# Altium footprint library CONN_HDR_MINI_ST_SMD.PcbLib: 102 footprints (part 4 of 7) (continued)
## HDRMINIS_M_1X19 [mm] "mini header (50mil pitch)" (continued)
3D body "BD021-03A-A1-0350-0200-0550-LB.stp": height 5.5, standoff 0, extent -12.07,-2.75 -8.26,2.75

## HDRMINIS_M_1X20 [mm] "mini header (50mil pitch)"
pads (20):
  oval 0.8x3.2 smd mask+0.1: 1(-12.065,-1.4) 2(-10.795,1.4) 3(-9.525,-1.4) 4(-8.255,1.4) 5(-6.985,-1.4) 6(-5.715,1.4) 7(-4.445,-1.4) 8(-3.175,1.4) 9(-1.905,-1.4) 10(-0.635,1.4) 11(0.635,-1.4) 12(1.905,1.4) 13(3.175,-1.4) 14(4.445,1.4) 15(5.715,-1.4) 16(6.985,1.4) 17(8.255,-1.4) 18(9.525,1.4) 19(10.795,-1.4) 20(12.065,1.4)
Top Overlay:
  circle w0.2: c-13.208,0 r0.2
  lines w0.2: -12.601,-0.8 -12.7,-0.635 -12.7,0.635 -12.601,0.8 -11.529,0.8 -11.43,0.635 -11.331,0.8 ; -11.529,-0.8 -11.43,-0.635 -11.331,-0.8 -10.259,-0.8 -10.16,-0.635 -10.061,-0.8 ; -10.259,0.8 -10.16,0.635 -10.061,0.8 -8.989,0.8 -8.89,0.635 -8.791,0.8 ; -8.989,-0.8 -8.89,-0.635 -8.791,-0.8 -7.719,-0.8 -7.62,-0.635 -7.521,-0.8 ; -7.719,0.8 -7.62,0.635 -7.521,0.8 -6.449,0.8 -6.35,0.635 -6.251,0.8 ; -6.449,-0.8 -6.35,-0.635 -6.251,-0.8 -5.179,-0.8 -5.08,-0.635 -4.981,-0.8 ; -5.179,0.8 -5.08,0.635 -4.981,0.8 -3.909,0.8 -3.81,0.635 -3.711,0.8 ; -3.909,-0.8 -3.81,-0.635 -3.711,-0.8 -2.639,-0.8 -2.54,-0.635 -2.441,-0.8 ; -2.639,0.8 -2.54,0.635 -2.441,0.8 -1.369,0.8 -1.27,0.635 -1.171,0.8 ; -1.369,-0.8 -1.27,-0.635 -1.171,-0.8 -0.099,-0.8 0,-0.635 0.099,-0.8 ; -0.099,0.8 0,0.635 0.099,0.8 1.171,0.8 1.27,0.635 1.369,0.8 ; 1.171,-0.8 1.27,-0.635 1.369,-0.8 2.441,-0.8 2.54,-0.635 2.639,-0.8 ; 2.441,0.8 2.54,0.635 2.639,0.8 3.711,0.8 3.81,0.635 3.909,0.8 ; 3.711,-0.8 3.81,-0.635 3.909,-0.8 4.981,-0.8 5.08,-0.635 5.179,-0.8 ; 4.981,0.8 5.08,0.635 5.179,0.8 6.251,0.8 6.35,0.635 6.449,0.8 ; 6.251,-0.8 6.35,-0.635 6.449,-0.8 7.521,-0.8 7.62,-0.635 7.719,-0.8 ; 7.521,0.8 7.62,0.635 7.719,0.8 8.791,0.8 8.89,0.635 8.989,0.8 ; 8.791,-0.8 8.89,-0.635 8.989,-0.8 10.061,-0.8 10.16,-0.635 10.259,-0.8 ; 10.061,0.8 10.16,0.635 10.259,0.8 11.331,0.8 11.43,0.635 11.529,0.8 ; 11.331,-0.8 11.43,-0.635 11.529,-0.8 12.601,-0.8 12.7,-0.635 12.7,0.635 12.601,0.8
3D body "BD021-02A-A1-0350-0200-0550-LB.stp": height 5.5, standoff 0, extent -12.7,-2.75 -10.16,2.75
3D body "BD021-02A-A1-0350-0200-0550-LB.stp": height 5.5, standoff 0, extent -10.16,-2.75 -7.62,2.75
3D body "BD021-02A-A1-0350-0200-0550-LB.stp": height 5.5, standoff 0, extent -7.62,-2.75 -5.08,2.75
3D body "BD021-02A-A1-0350-0200-0550-LB.stp": height 5.5, standoff 0, extent -5.08,-2.75 -2.54,2.75
3D body "BD021-02A-A1-0350-0200-0550-LB.stp": height 5.5, standoff 0, extent -2.54,-2.75 0,2.75
3D body "BD021-02A-A1-0350-0200-0550-LB.stp": height 5.5, standoff 0, extent 0,-2.75 2.54,2.75
3D body "BD021-02A-A1-0350-0200-0550-LB.stp": height 5.5, standoff 0, extent 2.54,-2.75 5.08,2.75
3D body "BD021-02A-A1-0350-0200-0550-LB.stp": height 5.5, standoff 0, extent 5.08,-2.75 7.62,2.75
3D body "BD021-02A-A1-0350-0200-0550-LB.stp": height 5.5, standoff 0, extent 7.62,-2.75 10.16,2.75
3D body "BD021-02A-A1-0350-0200-0550-LB.stp": height 5.5, standoff 0, extent 10.16,-2.75 12.7,2.75

## HDRMINIS_M_1X21 [mm] "mini header (50mil pitch)"
pads (21):
  oval 0.8x3.2 smd mask+0.1: 1(-12.7,1.4) 2(-11.43,-1.4) 3(-10.16,1.4) 4(-8.89,-1.4) 5(-7.62,1.4) 6(-6.35,-1.4) 7(-5.08,1.4) 8(-3.81,-1.4) 9(-2.54,1.4) 10(-1.27,-1.4) 11(0,1.4) 12(1.27,-1.4) 13(2.54,1.4) 14(3.81,-1.4) 15(5.08,1.4) 16(6.35,-1.4) 17(7.62,1.4) 18(8.89,-1.4) 19(10.16,1.4) 20(11.43,-1.4) 21(12.7,1.4)
Top Overlay:
  circle w0.2: c-13.843,0 r0.2
  lines w0.2: -13.236,0.8 -13.335,0.635 -13.335,-0.635 -13.236,-0.8 -12.164,-0.8 -12.065,-0.635 -11.966,-0.8 ; -12.164,0.8 -12.065,0.635 -11.966,0.8 -10.894,0.8 -10.795,0.635 -10.696,0.8 ; -10.894,-0.8 -10.795,-0.635 -10.696,-0.8 -9.624,-0.8 -9.525,-0.635 -9.426,-0.8 ; -9.624,0.8 -9.525,0.635 -9.426,0.8 -8.354,0.8 -8.255,0.635 -8.156,0.8 ; -8.354,-0.8 -8.255,-0.635 -8.156,-0.8 -7.084,-0.8 -6.985,-0.635 -6.886,-0.8 ; -7.084,0.8 -6.985,0.635 -6.886,0.8 -5.814,0.8 -5.715,0.635 -5.616,0.8 ; -5.814,-0.8 -5.715,-0.635 -5.616,-0.8 -4.544,-0.8 -4.445,-0.635 -4.346,-0.8 ; -4.544,0.8 -4.445,0.635 -4.346,0.8 -3.274,0.8 -3.175,0.635 -3.076,0.8 ; -3.274,-0.8 -3.175,-0.635 -3.076,-0.8 -2.004,-0.8 -1.905,-0.635 -1.806,-0.8 ; -2.004,0.8 -1.905,0.635 -1.806,0.8 -0.734,0.8 -0.635,0.635 -0.536,0.8 ; -0.734,-0.8 -0.635,-0.635 -0.536,-0.8 0.536,-0.8 0.635,-0.635 0.734,-0.8 ; 0.536,0.8 0.635,0.635 0.734,0.8 1.806,0.8 1.905,0.635 2.004,0.8 ; 1.806,-0.8 1.905,-0.635 2.004,-0.8 3.076,-0.8 3.175,-0.635 3.274,-0.8 ; 3.076,0.8 3.175,0.635 3.274,0.8 4.346,0.8 4.445,0.635 4.544,0.8 ; 4.346,-0.8 4.445,-0.635 4.544,-0.8 5.616,-0.8 5.715,-0.635 5.814,-0.8 ; 5.616,0.8 5.715,0.635 5.814,0.8 6.886,0.8 6.985,0.635 7.084,0.8 ; 6.886,-0.8 6.985,-0.635 7.084,-0.8 8.156,-0.8 8.255,-0.635 8.354,-0.8 ; 8.156,0.8 8.255,0.635 8.354,0.8 9.426,0.8 9.525,0.635 9.624,0.8 ; 9.426,-0.8 9.525,-0.635 9.624,-0.8 10.696,-0.8 10.795,-0.635 10.894,-0.8 ; 10.696,0.8 10.795,0.635 10.894,0.8 11.966,0.8 12.065,0.635 12.164,0.8 ; 11.966,-0.8 12.065,-0.635 12.164,-0.8 13.236,-0.8 13.335,-0.635 13.335,0.635 13.236,0.8
3D body "BD021-03A-A1-0350-0200-0550-LB.stp": height 5.5, standoff 0, extent -13.34,-2.75 -9.53,2.75
3D body "BD021-02A-A1-0350-0200-0550-LB.stp": height 5.5, standoff 0, extent -9.525,-2.75 -6.985,2.75
3D body "BD021-02A-A1-0350-0200-0550-LB.stp": height 5.5, standoff 0, extent -6.985,-2.75 -4.445,2.75
3D body "BD021-02A-A1-0350-0200-0550-LB.stp": height 5.5, standoff 0, extent -4.445,-2.75 -1.905,2.75
3D body "BD021-02A-A1-0350-0200-0550-LB.stp": height 5.5, standoff 0, extent -1.905,-2.75 0.635,2.75
3D body "BD021-02A-A1-0350-0200-0550-LB.stp": height 5.5, standoff 0, extent 0.635,-2.75 3.175,2.75
3D body "BD021-02A-A1-0350-0200-0550-LB.stp": height 5.5, standoff 0, extent 3.175,-2.75 5.715,2.75
3D body "BD021-02A-A1-0350-0200-0550-LB.stp": height 5.5, standoff 0, extent 5.715,-2.75 8.255,2.75
3D body "BD021-02A-A1-0350-0200-0550-LB.stp": height 5.5, standoff 0, extent 8.255,-2.75 10.795,2.75
3D body "BD021-02A-A1-0350-0200-0550-LB.stp": height 5.5, standoff 0, extent 10.795,-2.75 13.335,2.75

## HDRMINIS_M_1X22 [mm] "mini header (50mil pitch)"
pads (22):
  oval 0.8x3.2 smd mask+0.1: 1(-13.335,-1.4) 2(-12.065,1.4) 3(-10.795,-1.4) 4(-9.525,1.4) 5(-8.255,-1.4) 6(-6.985,1.4) 7(-5.715,-1.4) 8(-4.445,1.4) 9(-3.175,-1.4) 10(-1.905,1.4) 11(-0.635,-1.4) 12(0.635,1.4) 13(1.905,-1.4) 14(3.175,1.4) 15(4.445,-1.4) 16(5.715,1.4) 17(6.985,-1.4) 18(8.255,1.4) 19(9.525,-1.4) 20(10.795,1.4) 21(12.065,-1.4) 22(13.335,1.4)
Top Overlay:
  circle w0.2: c-14.478,0 r0.2
  lines w0.2: -13.871,-0.8 -13.97,-0.635 -13.97,0.635 -13.871,0.8 -12.799,0.8 -12.7,0.635 -12.601,0.8 ; -12.799,-0.8 -12.7,-0.635 -12.601,-0.8 -11.529,-0.8 -11.43,-0.635 -11.331,-0.8 ; -11.529,0.8 -11.43,0.635 -11.331,0.8 -10.259,0.8 -10.16,0.635 -10.061,0.8 ; -10.259,-0.8 -10.16,-0.635 -10.061,-0.8 -8.989,-0.8 -8.89,-0.635 -8.791,-0.8 ; -8.989,0.8 -8.89,0.635 -8.791,0.8 -7.719,0.8 -7.62,0.635 -7.521,0.8 ; -7.719,-0.8 -7.62,-0.635 -7.521,-0.8 -6.449,-0.8 -6.35,-0.635 -6.251,-0.8 ; -6.449,0.8 -6.35,0.635 -6.251,0.8 -5.179,0.8 -5.08,0.635 -4.981,0.8 ; -5.179,-0.8 -5.08,-0.635 -4.981,-0.8 -3.909,-0.8 -3.81,-0.635 -3.711,-0.8 ; -3.909,0.8 -3.81,0.635 -3.711,0.8 -2.639,0.8 -2.54,0.635 -2.441,0.8 ; -2.639,-0.8 -2.54,-0.635 -2.441,-0.8 -1.369,-0.8 -1.27,-0.635 -1.171,-0.8 ; -1.369,0.8 -1.27,0.635 -1.171,0.8 -0.099,0.8 0,0.635 0.099,0.8 ; -0.099,-0.8 0,-0.635 0.099,-0.8 1.171,-0.8 1.27,-0.635 1.369,-0.8 ; 1.171,0.8 1.27,0.635 1.369,0.8 2.441,0.8 2.54,0.635 2.639,0.8 ; 2.441,-0.8 2.54,-0.635 2.639,-0.8 3.711,-0.8 3.81,-0.635 3.909,-0.8 ; 3.711,0.8 3.81,0.635 3.909,0.8 4.981,0.8 5.08,0.635 5.179,0.8 ; 4.981,-0.8 5.08,-0.635 5.179,-0.8 6.251,-0.8 6.35,-0.635 6.449,-0.8 ; 6.251,0.8 6.35,0.635 6.449,0.8 7.521,0.8 7.62,0.635 7.719,0.8 ; 7.521,-0.8 7.62,-0.635 7.719,-0.8 8.791,-0.8 8.89,-0.635 8.989,-0.8 ; 8.791,0.8 8.89,0.635 8.989,0.8 10.061,0.8 10.16,0.635 10.259,0.8 ; 10.061,-0.8 10.16,-0.635 10.259,-0.8 11.331,-0.8 11.43,-0.635 11.529,-0.8 ; 11.331,0.8 11.43,0.635 11.529,0.8 12.601,0.8 12.7,0.635 12.799,0.8 ; 12.601,-0.8 12.7,-0.635 12.799,-0.8 13.871,-0.8 13.97,-0.635 13.97,0.635 13.871,0.8
3D body "BD021-02A-A1-0350-0200-0550-LB.stp": height 5.5, standoff 0, extent -13.97,-2.75 -11.43,2.75
3D body "BD021-02A-A1-0350-0200-0550-LB.stp": height 5.5, standoff 0, extent -11.43,-2.75 -8.89,2.75
3D body "BD021-02A-A1-0350-0200-0550-LB.stp": height 5.5, standoff 0, extent -8.89,-2.75 -6.35,2.75
3D body "BD021-02A-A1-0350-0200-0550-LB.stp": height 5.5, standoff 0, extent -6.35,-2.75 -3.81,2.75
3D body "BD021-02A-A1-0350-0200-0550-LB.stp": height 5.5, standoff 0, extent -3.81,-2.75 -1.27,2.75
3D body "BD021-02A-A1-0350-0200-0550-LB.stp": height 5.5, standoff 0, extent -1.27,-2.75 1.27,2.75
3D body "BD021-02A-A1-0350-0200-0550-LB.stp": height 5.5, standoff 0, extent 1.27,-2.75 3.81,2.75
3D body "BD021-02A-A1-0350-0200-0550-LB.stp": height 5.5, standoff 0, extent 3.81,-2.75 6.35,2.75
3D body "BD021-02A-A1-0350-0200-0550-LB.stp": height 5.5, standoff 0, extent 6.35,-2.75 8.89,2.75
3D body "BD021-02A-A1-0350-0200-0550-LB.stp": height 5.5, standoff 0, extent 8.89,-2.75 11.43,2.75
3D body "BD021-02A-A1-0350-0200-0550-LB.stp": height 5.5, standoff 0, extent 11.43,-2.75 13.97,2.75

## HDRMINIS_M_1X23 [mm] "mini header (50mil pitch)"
pads (23):
  oval 0.8x3.2 smd mask+0.1: 1(-13.97,1.4) 2(-12.7,-1.4) 3(-11.43,1.4) 4(-10.16,-1.4) 5(-8.89,1.4) 6(-7.62,-1.4) 7(-6.35,1.4) 8(-5.08,-1.4) 9(-3.81,1.4) 10(-2.54,-1.4) 11(-1.27,1.4) 12(0,-1.4) 13(1.27,1.4) 14(2.54,-1.4) 15(3.81,1.4) 16(5.08,-1.4) 17(6.35,1.4) 18(7.62,-1.4) 19(8.89,1.4) 20(10.16,-1.4) 21(11.43,1.4) 22(12.7,-1.4) 23(13.97,1.4)
Top Overlay:
  circle w0.2: c-15.113,0 r0.2
  lines w0.2: -14.506,0.8 -14.605,0.635 -14.605,-0.635 -14.506,-0.8 -13.434,-0.8 -13.335,-0.635 -13.236,-0.8 ; -13.335,0.635 -13.236,0.8 -12.164,0.8 -12.065,0.635 -11.966,0.8 ; -12.164,-0.8 -12.065,-0.635 -11.966,-0.8 -10.894,-0.8 -10.795,-0.635 -10.696,-0.8 ; -10.894,0.8 -10.795,0.635 -10.696,0.8 -9.624,0.8 -9.525,0.635 -9.426,0.8 ; -9.624,-0.8 -9.525,-0.635 -9.426,-0.8 -8.354,-0.8 -8.255,-0.635 -8.156,-0.8 ; -8.354,0.8 -8.255,0.635 -8.156,0.8 -7.084,0.8 -6.985,0.635 -6.886,0.8 ; -7.084,-0.8 -6.985,-0.635 -6.886,-0.8 -5.814,-0.8 -5.715,-0.635 -5.616,-0.8 ; -5.814,0.8 -5.715,0.635 -5.616,0.8 -4.544,0.8 -4.445,0.635 -4.346,0.8 ; -4.544,-0.8 -4.445,-0.635 -4.346,-0.8 -3.274,-0.8 -3.175,-0.635 -3.076,-0.8 ; -3.274,0.8 -3.175,0.635 -3.076,0.8 -2.004,0.8 -1.905,0.635 -1.806,0.8 ; -2.004,-0.8 -1.905,-0.635 -1.806,-0.8 -0.734,-0.8 -0.635,-0.635 -0.536,-0.8 ; -0.734,0.8 -0.635,0.635 -0.536,0.8 0.536,0.8 0.635,0.635 0.734,0.8 ; 0.536,-0.8 0.635,-0.635 0.734,-0.8 1.806,-0.8 1.905,-0.635 2.004,-0.8 ; 1.806,0.8 1.905,0.635 2.004,0.8 3.076,0.8 3.175,0.635 3.274,0.8 ; 3.076,-0.8 3.175,-0.635 3.274,-0.8 4.346,-0.8 4.445,-0.635 4.544,-0.8 ; 4.346,0.8 4.445,0.635 4.544,0.8 5.616,0.8 5.715,0.635 5.814,0.8 ; 5.616,-0.8 5.715,-0.635 5.814,-0.8 6.886,-0.8 6.985,-0.635 7.084,-0.8 ; 6.886,0.8 6.985,0.635 7.084,0.8 8.156,0.8 8.255,0.635 8.354,0.8 ; 8.156,-0.8 8.255,-0.635 8.354,-0.8 9.426,-0.8 9.525,-0.635 9.624,-0.8 ; 9.426,0.8 9.525,0.635 9.624,0.8 10.696,0.8 10.795,0.635 10.894,0.8 ; 10.696,-0.8 10.795,-0.635 10.894,-0.8 11.966,-0.8 12.065,-0.635 12.164,-0.8 ; 11.966,0.8 12.065,0.635 12.164,0.8 13.236,0.8 13.335,0.635 13.434,0.8 ; 13.236,-0.8 13.335,-0.635 13.434,-0.8 14.506,-0.8 14.605,-0.635 14.605,0.635 14.506,0.8
3D body "BD021-02A-A1-0350-0200-0550-LB.stp": height 5.5, standoff 0, extent 12.065,-2.75 14.605,2.75
3D body "BD021-02A-A1-0350-0200-0550-LB.stp": height 5.5, standoff 0, extent 9.525,-2.75 12.065,2.75
3D body "BD021-02A-A1-0350-0200-0550-LB.stp": height 5.5, standoff 0, extent 6.985,-2.75 9.525,2.75
3D body "BD021-02A-A1-0350-0200-0550-LB.stp": height 5.5, standoff 0, extent 4.445,-2.75 6.985,2.75
3D body "BD021-02A-A1-0350-0200-0550-LB.stp": height 5.5, standoff 0, extent 1.905,-2.75 4.445,2.75
3D body "BD021-02A-A1-0350-0200-0550-LB.stp": height 5.5, standoff 0, extent -0.635,-2.75 1.905,2.75
3D body "BD021-02A-A1-0350-0200-0550-LB.stp": height 5.5, standoff 0, extent -3.175,-2.75 -0.635,2.75
3D body "BD021-02A-A1-0350-0200-0550-LB.stp": height 5.5, standoff 0, extent -5.715,-2.75 -3.175,2.75
3D body "BD021-02A-A1-0350-0200-0550-LB.stp": height 5.5, standoff 0, extent -8.255,-2.75 -5.715,2.75
3D body "BD021-02A-A1-0350-0200-0550-LB.stp": height 5.5, standoff 0, extent -10.795,-2.75 -8.255,2.75
3D body "BD021-03A-A1-0350-0200-0550-LB.stp": height 5.5, standoff 0, extent -14.61,-2.75 -10.8,2.75

## HDRMINIS_M_1X24 [mm] "mini header (50mil pitch)"
pads (24):
  oval 0.8x3.2 smd mask+0.1: 1(-14.605,-1.4) 2(-13.335,1.4) 3(-12.065,-1.4) 4(-10.795,1.4) 5(-9.525,-1.4) 6(-8.255,1.4) 7(-6.985,-1.4) 8(-5.715,1.4) 9(-4.445,-1.4) 10(-3.175,1.4) 11(-1.905,-1.4) 12(-0.635,1.4) 13(0.635,-1.4) 14(1.905,1.4) 15(3.175,-1.4) 16(4.445,1.4) 17(5.715,-1.4) 18(6.985,1.4) 19(8.255,-1.4) 20(9.525,1.4) 21(10.795,-1.4) 22(12.065,1.4) 23(13.335,-1.4) 24(14.605,1.4)
Top Overlay:
  circle w0.2: c-15.748,0 r0.2
  lines w0.2: -15.141,-0.8 -15.24,-0.635 -15.24,0.635 -15.141,0.8 -14.069,0.8 -13.97,0.635 -13.871,0.8 ; -14.069,-0.8 -13.97,-0.635 -13.871,-0.8 -12.799,-0.8 -12.7,-0.635 -12.601,-0.8 ; -12.799,0.8 -12.7,0.635 -12.601,0.8 -11.529,0.8 -11.43,0.635 -11.331,0.8 ; -11.529,-0.8 -11.43,-0.635 -11.331,-0.8 -10.259,-0.8 -10.16,-0.635 -10.061,-0.8 ; -10.259,0.8 -10.16,0.635 -10.061,0.8 -8.989,0.8 -8.89,0.635 -8.791,0.8 ; -8.989,-0.8 -8.89,-0.635 -8.791,-0.8 -7.719,-0.8 -7.62,-0.635 -7.521,-0.8 ; -7.719,0.8 -7.62,0.635 -7.521,0.8 -6.449,0.8 -6.35,0.635 -6.251,0.8 ; -6.449,-0.8 -6.35,-0.635 -6.251,-0.8 -5.179,-0.8 -5.08,-0.635 -4.981,-0.8 ; -5.179,0.8 -5.08,0.635 -4.981,0.8 -3.909,0.8 -3.81,0.635 -3.711,0.8 ; -3.909,-0.8 -3.81,-0.635 -3.711,-0.8 -2.639,-0.8 -2.54,-0.635 -2.441,-0.8 ; -2.639,0.8 -2.54,0.635 -2.441,0.8 -1.369,0.8 -1.27,0.635 -1.171,0.8 ; -1.369,-0.8 -1.27,-0.635 -1.171,-0.8 -0.099,-0.8 0,-0.635 0.099,-0.8 ; -0.099,0.8 0,0.635 0.099,0.8 1.171,0.8 1.27,0.635 1.369,0.8 ; 1.171,-0.8 1.27,-0.635 1.369,-0.8 2.441,-0.8 2.54,-0.635 2.639,-0.8 ; 2.441,0.8 2.54,0.635 2.639,0.8 3.711,0.8 3.81,0.635 3.909,0.8 ; 3.711,-0.8 3.81,-0.635 3.909,-0.8 4.981,-0.8 5.08,-0.635 5.179,-0.8 ; 4.981,0.8 5.08,0.635 5.179,0.8 6.251,0.8 6.35,0.635 6.449,0.8 ; 6.251,-0.8 6.35,-0.635 6.449,-0.8 7.521,-0.8 7.62,-0.635 7.719,-0.8 ; 7.521,0.8 7.62,0.635 7.719,0.8 8.791,0.8 8.89,0.635 8.989,0.8 ; 8.791,-0.8 8.89,-0.635 8.989,-0.8 10.061,-0.8 10.16,-0.635 10.259,-0.8 ; 10.061,0.8 10.16,0.635 10.259,0.8 11.331,0.8 11.43,0.635 11.529,0.8 ; 11.331,-0.8 11.43,-0.635 11.529,-0.8 12.601,-0.8 12.7,-0.635 12.799,-0.8 ; 12.601,0.8 12.7,0.635 12.799,0.8 13.871,0.8 13.97,0.635 14.069,0.8 ; 13.871,-0.8 13.97,-0.635 14.069,-0.8 15.141,-0.8 15.24,-0.635 15.24,0.635 15.141,0.8
3D body "BD021-02A-A1-0350-0200-0550-LB.stp": height 5.5, standoff 0, extent -15.24,-2.75 -12.7,2.75
3D body "BD021-02A-A1-0350-0200-0550-LB.stp": height 5.5, standoff 0, extent -12.7,-2.75 -10.16,2.75
3D body "BD021-02A-A1-0350-0200-0550-LB.stp": height 5.5, standoff 0, extent -10.16,-2.75 -7.62,2.75
3D body "BD021-02A-A1-0350-0200-0550-LB.stp": height 5.5, standoff 0, extent -7.62,-2.75 -5.08,2.75
3D body "BD021-02A-A1-0350-0200-0550-LB.stp": height 5.5, standoff 0, extent -5.08,-2.75 -2.54,2.75
3D body "BD021-02A-A1-0350-0200-0550-LB.stp": height 5.5, standoff 0, extent -2.54,-2.75 0,2.75
3D body "BD021-02A-A1-0350-0200-0550-LB.stp": height 5.5, standoff 0, extent 0,-2.75 2.54,2.75
3D body "BD021-02A-A1-0350-0200-0550-LB.stp": height 5.5, standoff 0, extent 2.54,-2.75 5.08,2.75
3D body "BD021-02A-A1-0350-0200-0550-LB.stp": height 5.5, standoff 0, extent 5.08,-2.75 7.62,2.75
3D body "BD021-02A-A1-0350-0200-0550-LB.stp": height 5.5, standoff 0, extent 7.62,-2.75 10.16,2.75
3D body "BD021-02A-A1-0350-0200-0550-LB.stp": height 5.5, standoff 0, extent 10.16,-2.75 12.7,2.75
3D body "BD021-02A-A1-0350-0200-0550-LB.stp": height 5.5, standoff 0, extent 12.7,-2.75 15.24,2.75

## HDRMINIS_M_1X25 [mm] "mini header (50mil pitch)"
pads (25):
  oval 0.8x3.2 smd mask+0.1: 1(-15.24,1.4) 2(-13.97,-1.4) 3(-12.7,1.4) 4(-11.43,-1.4) 5(-10.16,1.4) 6(-8.89,-1.4) 7(-7.62,1.4) 8(-6.35,-1.4) 9(-5.08,1.4) 10(-3.81,-1.4) 11(-2.54,1.4) 12(-1.27,-1.4) 13(0,1.4) 14(1.27,-1.4) 15(2.54,1.4) 16(3.81,-1.4) 17(5.08,1.4) 18(6.35,-1.4) 19(7.62,1.4) 20(8.89,-1.4) 21(10.16,1.4) 22(11.43,-1.4) 23(12.7,1.4) 24(13.97,-1.4) 25(15.24,1.4)
Top Overlay:
  circle w0.2: c-16.383,0 r0.2
  lines w0.2: -15.776,0.8 -15.875,0.635 -15.875,-0.635 -15.776,-0.8 -14.704,-0.8 -14.605,-0.635 -14.506,-0.8 ; -14.605,0.635 -14.506,0.8 -13.434,0.8 -13.335,0.635 -13.236,0.8 ; -13.434,-0.8 -13.335,-0.635 -13.236,-0.8 -12.164,-0.8 -12.065,-0.635 -11.966,-0.8 ; -12.164,0.8 -12.065,0.635 -11.966,0.8 -10.894,0.8 -10.795,0.635 -10.696,0.8 ; -10.894,-0.8 -10.795,-0.635 -10.696,-0.8 -9.624,-0.8 -9.525,-0.635 -9.426,-0.8 ; -9.624,0.8 -9.525,0.635 -9.426,0.8 -8.354,0.8 -8.255,0.635 -8.156,0.8 ; -8.354,-0.8 -8.255,-0.635 -8.156,-0.8 -7.084,-0.8 -6.985,-0.635 -6.886,-0.8 ; -7.084,0.8 -6.985,0.635 -6.886,0.8 -5.814,0.8 -5.715,0.635 -5.616,0.8 ; -5.814,-0.8 -5.715,-0.635 -5.616,-0.8 -4.544,-0.8 -4.445,-0.635 -4.346,-0.8 ; -4.544,0.8 -4.445,0.635 -4.346,0.8 -3.274,0.8 -3.175,0.635 -3.076,0.8 ; -3.274,-0.8 -3.175,-0.635 -3.076,-0.8 -2.004,-0.8 -1.905,-0.635 -1.806,-0.8 ; -2.004,0.8 -1.905,0.635 -1.806,0.8 -0.734,0.8 -0.635,0.635 -0.536,0.8 ; -0.734,-0.8 -0.635,-0.635 -0.536,-0.8 0.536,-0.8 0.635,-0.635 0.734,-0.8 ; 0.536,0.8 0.635,0.635 0.734,0.8 1.806,0.8 1.905,0.635 2.004,0.8 ; 1.806,-0.8 1.905,-0.635 2.004,-0.8 3.076,-0.8 3.175,-0.635 3.274,-0.8 ; 3.076,0.8 3.175,0.635 3.274,0.8 4.346,0.8 4.445,0.635 4.544,0.8 ; 4.346,-0.8 4.445,-0.635 4.544,-0.8 5.616,-0.8 5.715,-0.635 5.814,-0.8 ; 5.616,0.8 5.715,0.635 5.814,0.8 6.886,0.8 6.985,0.635 7.084,0.8 ; 6.886,-0.8 6.985,-0.635 7.084,-0.8 8.156,-0.8 8.255,-0.635 8.354,-0.8 ; 8.156,0.8 8.255,0.635 8.354,0.8 9.426,0.8 9.525,0.635 9.624,0.8 ; 9.426,-0.8 9.525,-0.635 9.624,-0.8 10.696,-0.8 10.795,-0.635 10.894,-0.8 ; 10.696,0.8 10.795,0.635 10.894,0.8 11.966,0.8 12.065,0.635 12.164,0.8 ; 11.966,-0.8 12.065,-0.635 12.164,-0.8 13.236,-0.8 13.335,-0.635 13.434,-0.8 ; 13.236,0.8 13.335,0.635 13.434,0.8 14.506,0.8 14.605,0.635 14.704,0.8 ; 14.506,-0.8 14.605,-0.635 14.704,-0.8 15.776,-0.8 15.875,-0.635 15.875,0.635 15.776,0.8
3D body "BD021-03A-A1-0350-0200-0550-LB.stp": height 5.5, standoff 0, extent -15.88,-2.75 -12.07,2.75
3D body "BD021-02A-A1-0350-0200-0550-LB.stp": height 5.5, standoff 0, extent -12.065,-2.75 -9.525,2.75
3D body "BD021-02A-A1-0350-0200-0550-LB.stp": height 5.5, standoff 0, extent -9.525,-2.75 -6.985,2.75
3D body "BD021-02A-A1-0350-0200-0550-LB.stp": height 5.5, standoff 0, extent -6.985,-2.75 -4.445,2.75
3D body "BD021-02A-A1-0350-0200-0550-LB.stp": height 5.5, standoff 0, extent -4.445,-2.75 -1.905,2.75
3D body "BD021-02A-A1-0350-0200-0550-LB.stp": height 5.5, standoff 0, extent -1.905,-2.75 0.635,2.75
3D body "BD021-02A-A1-0350-0200-0550-LB.stp": height 5.5, standoff 0, extent 0.635,-2.75 3.175,2.75
3D body "BD021-02A-A1-0350-0200-0550-LB.stp": height 5.5, standoff 0, extent 3.175,-2.75 5.715,2.75
3D body "BD021-02A-A1-0350-0200-0550-LB.stp": height 5.5, standoff 0, extent 5.715,-2.75 8.255,2.75
3D body "BD021-02A-A1-0350-0200-0550-LB.stp": height 5.5, standoff 0, extent 8.255,-2.75 10.795,2.75
3D body "BD021-02A-A1-0350-0200-0550-LB.stp": height 5.5, standoff 0, extent 10.795,-2.75 13.335,2.75
3D body "BD021-02A-A1-0350-0200-0550-LB.stp": height 5.5, standoff 0, extent 13.335,-2.75 15.875,2.75

## HDRMINIS_M_1X26 [mm] "mini header (50mil pitch)"
pads (26):
  oval 0.8x3.2 smd mask+0.1: 1(-15.875,-1.4) 2(-14.605,1.4) 3(-13.335,-1.4) 4(-12.065,1.4) 5(-10.795,-1.4) 6(-9.525,1.4) 7(-8.255,-1.4) 8(-6.985,1.4) 9(-5.715,-1.4) 10(-4.445,1.4) 11(-3.175,-1.4) 12(-1.905,1.4) 13(-0.635,-1.4) 14(0.635,1.4) 15(1.905,-1.4) 16(3.175,1.4) 17(4.445,-1.4) 18(5.715,1.4) 19(6.985,-1.4) 20(8.255,1.4) 21(9.525,-1.4) 22(10.795,1.4) 23(12.065,-1.4) 24(13.335,1.4) 25(14.605,-1.4) 26(15.875,1.4)
Top Overlay:
  circle w0.2: c-17.018,0 r0.2
  lines w0.2: -16.411,-0.8 -16.51,-0.635 -16.51,0.635 -16.411,0.8 -15.339,0.8 -15.24,0.635 -15.141,0.8 ; -15.339,-0.8 -15.24,-0.635 -15.141,-0.8 -14.069,-0.8 -13.97,-0.635 -13.871,-0.8 ; -14.069,0.8 -13.97,0.635 -13.871,0.8 -12.799,0.8 -12.7,0.635 -12.601,0.8 ; -12.799,-0.8 -12.7,-0.635 -12.601,-0.8 -11.529,-0.8 -11.43,-0.635 -11.331,-0.8 ; -11.529,0.8 -11.43,0.635 -11.331,0.8 -10.259,0.8 -10.16,0.635 -10.061,0.8 ; -10.259,-0.8 -10.16,-0.635 -10.061,-0.8 -8.989,-0.8 -8.89,-0.635 -8.791,-0.8 ; -8.989,0.8 -8.89,0.635 -8.791,0.8 -7.719,0.8 -7.62,0.635 -7.521,0.8 ; -7.719,-0.8 -7.62,-0.635 -7.521,-0.8 -6.449,-0.8 -6.35,-0.635 -6.251,-0.8 ; -6.449,0.8 -6.35,0.635 -6.251,0.8 -5.179,0.8 -5.08,0.635 -4.981,0.8 ; -5.179,-0.8 -5.08,-0.635 -4.981,-0.8 -3.909,-0.8 -3.81,-0.635 -3.711,-0.8 ; -3.909,0.8 -3.81,0.635 -3.711,0.8 -2.639,0.8 -2.54,0.635 -2.441,0.8 ; -2.639,-0.8 -2.54,-0.635 -2.441,-0.8 -1.369,-0.8 -1.27,-0.635 -1.171,-0.8 ; -1.369,0.8 -1.27,0.635 -1.171,0.8 -0.099,0.8 0,0.635 0.099,0.8 ; -0.099,-0.8 0,-0.635 0.099,-0.8 1.171,-0.8 1.27,-0.635 1.369,-0.8 ; 1.171,0.8 1.27,0.635 1.369,0.8 2.441,0.8 2.54,0.635 2.639,0.8 ; 2.441,-0.8 2.54,-0.635 2.639,-0.8 3.711,-0.8 3.81,-0.635 3.909,-0.8 ; 3.711,0.8 3.81,0.635 3.909,0.8 4.981,0.8 5.08,0.635 5.179,0.8 ; 4.981,-0.8 5.08,-0.635 5.179,-0.8 6.251,-0.8 6.35,-0.635 6.449,-0.8 ; 6.251,0.8 6.35,0.635 6.449,0.8 7.521,0.8 7.62,0.635 7.719,0.8 ; 7.521,-0.8 7.62,-0.635 7.719,-0.8 8.791,-0.8 8.89,-0.635 8.989,-0.8 ; 8.791,0.8 8.89,0.635 8.989,0.8 10.061,0.8 10.16,0.635 10.259,0.8 ; 10.061,-0.8 10.16,-0.635 10.259,-0.8 11.331,-0.8 11.43,-0.635 11.529,-0.8 ; 11.331,0.8 11.43,0.635 11.529,0.8 12.601,0.8 12.7,0.635 12.799,0.8 ; 12.601,-0.8 12.7,-0.635 12.799,-0.8 13.871,-0.8 13.97,-0.635 14.069,-0.8 ; 13.871,0.8 13.97,0.635 14.069,0.8 15.141,0.8 15.24,0.635 15.339,0.8 ; 15.141,-0.8 15.24,-0.635 15.339,-0.8 16.411,-0.8 16.51,-0.635 16.51,0.635 16.411,0.8
3D body "BD021-02A-A1-0350-0200-0550-LB.stp": height 5.5, standoff 0, extent -16.51,-2.75 -13.97,2.75
3D body "BD021-02A-A1-0350-0200-0550-LB.stp": height 5.5, standoff 0, extent -13.97,-2.75 -11.43,2.75
3D body "BD021-02A-A1-0350-0200-0550-LB.stp": height 5.5, standoff 0, extent -11.43,-2.75 -8.89,2.75
3D body "BD021-02A-A1-0350-0200-0550-LB.stp": height 5.5, standoff 0, extent -8.89,-2.75 -6.35,2.75
3D body "BD021-02A-A1-0350-0200-0550-LB.stp": height 5.5, standoff 0, extent -6.35,-2.75 -3.81,2.75
3D body "BD021-02A-A1-0350-0200-0550-LB.stp": height 5.5, standoff 0, extent -3.81,-2.75 -1.27,2.75
3D body "BD021-02A-A1-0350-0200-0550-LB.stp": height 5.5, standoff 0, extent -1.27,-2.75 1.27,2.75
3D body "BD021-02A-A1-0350-0200-0550-LB.stp": height 5.5, standoff 0, extent 1.27,-2.75 3.81,2.75
3D body "BD021-02A-A1-0350-0200-0550-LB.stp": height 5.5, standoff 0, extent 3.81,-2.75 6.35,2.75
3D body "BD021-02A-A1-0350-0200-0550-LB.stp": height 5.5, standoff 0, extent 6.35,-2.75 8.89,2.75
3D body "BD021-02A-A1-0350-0200-0550-LB.stp": height 5.5, standoff 0, extent 8.89,-2.75 11.43,2.75
3D body "BD021-02A-A1-0350-0200-0550-LB.stp": height 5.5, standoff 0, extent 11.43,-2.75 13.97,2.75
3D body "BD021-02A-A1-0350-0200-0550-LB.stp": height 5.5, standoff 0, extent 13.97,-2.75 16.51,2.75